# Altium footprint library STM32F407开发板.PcbLib: 51 footprints (part 4 of 4)
Each footprint in its own frame and in the unit in brackets; x right, y up, seen from the top. Pads: shape width x height; smd on the part's side, far side on the other; paste and mask are expansions set on the pad; w line width, h text height; cw(c..) or ccw(c..) is an arc to the next point about the centre after c.
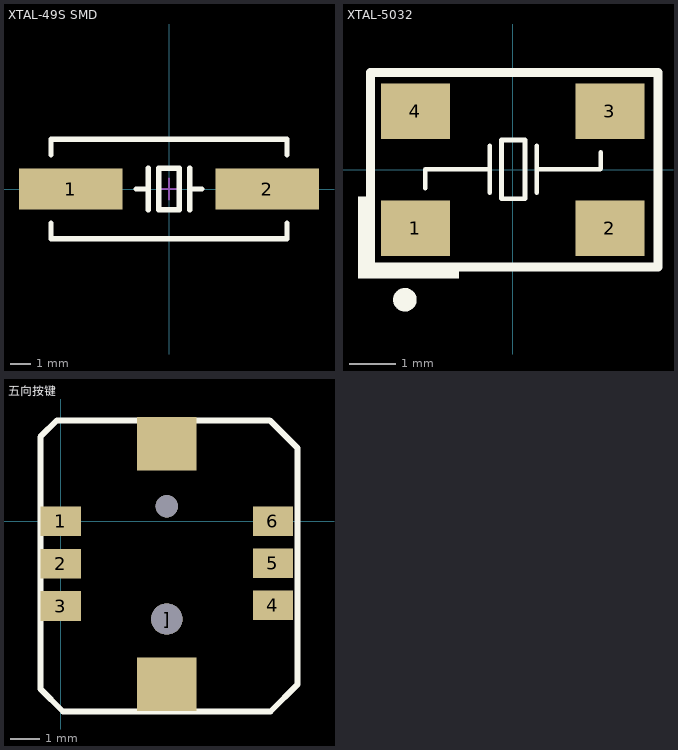
[diagram p3: the footprints below, top view; thin cyan lines are the x and y axes]

## XTAL-49S SMD [mm]
pads (2):
  rect 5x2 smd: 1(-4.75,0) 2(4.75,0)
Top Overlay:
  lines w0.254: -5.7,-1.65 -5.7,-2.4 5.7,-2.4 5.7,-1.65 ; -5.7,1.65 -5.7,2.4 5.7,2.4 5.7,1.65 ; -1.6,0 -1,0 ; -1,-1 -1,1 ; 1,-1 1,1 ; 1,0 1.6,0 ; -0.5,-1 0.5,-1 0.5,1 -0.5,1 -0.5,-1
Mechanical 15:
  lines w0.076: -0.508,0 0.508,0 ; 0,-0.508 0,0.508
3D body "User Library-hc49_cystal.STEP": height 4, standoff 0, extent -6.7,-2.462 6.7,2.438

## XTAL-5032 [mm]
pads (4):
  rect 1.5x1.2 smd: 1(-2.108,-1.27) 2(2.108,-1.27) 3(2.108,1.27) 4(-2.108,1.27)
Top Overlay:
  circle w0.254: c-2.337,-2.819 r0.127
  rectangle: -3.175,-2.362 -1.168,-2.108
  rectangle: -3.353,-2.362 -3.175,-0.584
  lines w0.1: -1.897,-0.406 -1.897,0.008 -0.496,0.008 ; -0.496,-0.5 -0.496,0.516 ; 0.52,-0.5 0.52,0.516 ; 0.52,0.008 1.902,0.008 1.905,0.016 1.905,0.381 ; -0.242,-0.627 -0.242,0.643 0.266,0.643 0.266,0.326 0.266,-0.309 0.266,-0.627 -0.242,-0.627
  lines w0.2: -3.079,-2.108 3.15,-2.108 3.15,2.108 -3.079,2.108 -3.079,-2.108
3D body "User Library-CRYSTALSMD5X32.STEP": height 1, standoff 0, extent -2.5,-1.6 2.5,1.6

## 五向按键 [mm] "贴片，7*7*5mm"
pads (10):
  rect 1.35x1 smd: 1(0,0) 2(0,-1.425) 3(0,-2.85) 4(7.146,-2.819) 5(7.146,-1.407) 6(7.146,0.005)
  round 1.05 hole 1.05: ](3.571,-3.292)
  rect 2x1.8 smd: ""(3.571,-5.485) ""(3.571,2.615)
  round 0.75 hole 0.75: ""(3.571,0.508)
Top Overlay:
  lines w0.2: -0.686,-5.639 -0.686,-0.051 -0.686,2.845 -0.127,3.404 7.036,3.404 7.976,2.464 7.976,-5.486 7.061,-6.401 0.076,-6.401 -0.686,-5.639
3D body: height 0.51, standoff 0, extent -0.686,-6.401 7.976,3.404